# Altium footprint library cool_library.PcbLib: 1182 footprints (part 16 of 75)
Each footprint in its own frame and in the unit in brackets; x right, y up, seen from the top. Pads: shape width x height; smd on the part's side, far side on the other; paste and mask are expansions set on the pad; w line width, h text height; cw(c..) or ccw(c..) is an arc to the next point about the centre after c.
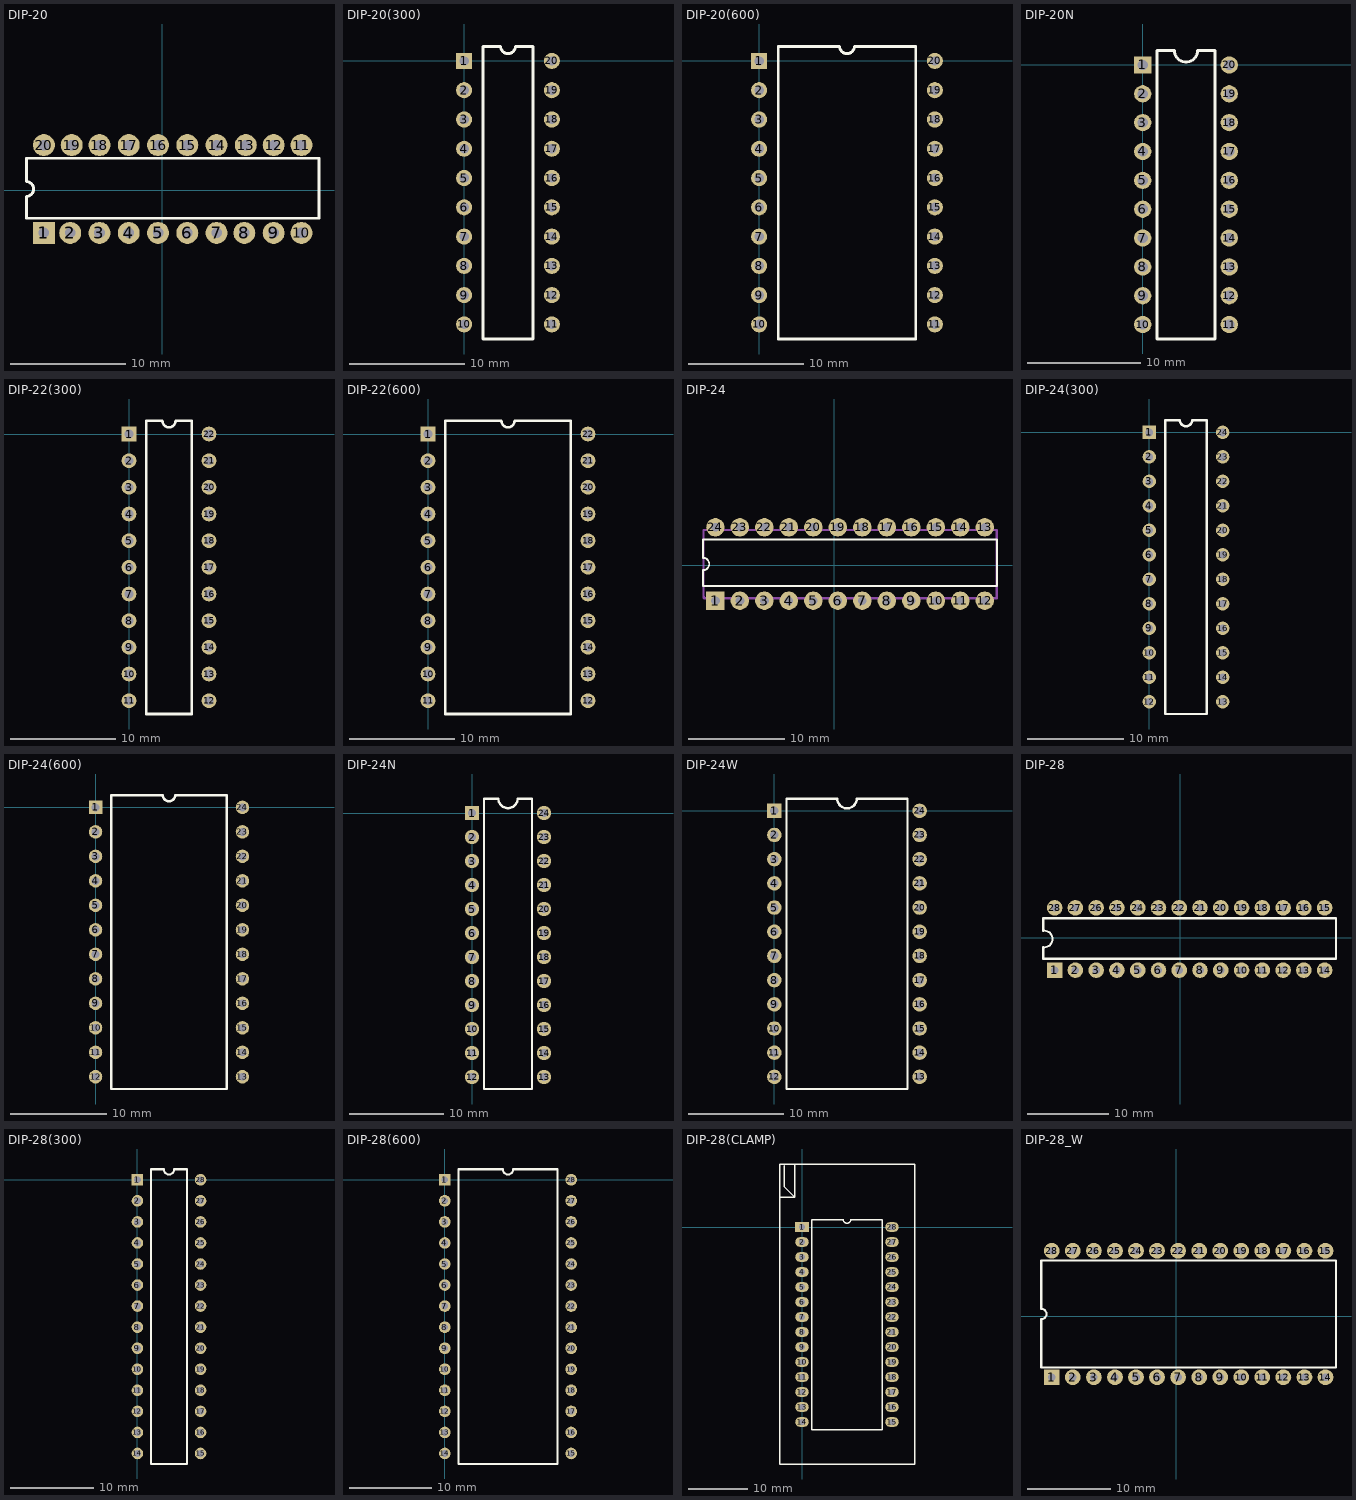
[diagram p15: the footprints below, top view; thin cyan lines are the x and y axes]

## DIP-20 [mil]
pads (20):
  rect 75x75 hole 36: 1(-405,-145)
  round 75 hole 36: 2(-315,-145) 3(-215,-145) 4(-115,-145) 5(-15,-145) 6(85,-145) 7(185,-145) 8(280,-145) 9(380,-145) 10(475,-145) 11(475,155) 12(380,155) 13(285,155) 14(185,155) 15(85,155) 16(-15,155) 17(-115,155) 18(-215,155) 19(-310,155) 20(-405,155)
Top Overlay:
  lines w10: -465,-95 -465,-20 ccw(c-465,5) -465,30 -465,110 535,110 535,-95 -465,-95
3D body: height 177.17, standoff -137.8, extent -468.93,-147.76 538.94,157.77

## DIP-20(300) [mil]
pads (20):
  rect 55x55 hole 32: 1(0,0)
  round 55 hole 32: 2(0,-100) 3(0,-200) 4(0,-300) 5(0,-400) 6(0,-500) 7(0,-600) 8(0,-700) 9(0,-800) 10(0,-900) 11(300,-900) 12(300,-800) 13(300,-700) 14(300,-600) 15(300,-500) 16(300,-400) 17(300,-300) 18(300,-200) 19(300,-100) 20(300,0)
Top Overlay:
  lines w10: 65,-950 65,50 125,50 ccw(c150,50) 175,50 235,50 235,-950 65,-950

## DIP-20(600) [mil]
pads (20):
  rect 55x55 hole 32: 1(0,0)
  round 55 hole 32: 2(0,-100) 3(0,-200) 4(0,-300) 5(0,-400) 6(0,-500) 7(0,-600) 8(0,-700) 9(0,-800) 10(0,-900) 11(600,-900) 12(600,-800) 13(600,-700) 14(600,-600) 15(600,-500) 16(600,-400) 17(600,-300) 18(600,-200) 19(600,-100) 20(600,0)
Top Overlay:
  lines w10: 65,-950 65,50 275,50 ccw(c300,50) 325,50 535,50 535,-950 65,-950

## DIP-20N [mil]
pads (20):
  rect 60x60 hole 35: 1(0,0)
  round 60 hole 35: 2(0,-100) 3(0,-200) 4(0,-300) 5(0,-400) 6(0,-500) 7(0,-600) 8(0,-700) 9(0,-800) 10(0,-900) 11(300,-900) 12(300,-800) 13(300,-700) 14(300,-600) 15(300,-500) 16(300,-400) 17(300,-300) 18(300,-200) 19(300,-100) 20(300,0)
Top Overlay:
  lines w10: 50,-950 250,-950 250,50 190,50 cw(c150,50) 110,50 50,50 50,-950

## DIP-22(300) [mil]
pads (22):
  rect 55x55 hole 32: 1(0,0)
  round 55 hole 32: 2(0,-100) 3(0,-200) 4(0,-300) 5(0,-400) 6(0,-500) 7(0,-600) 8(0,-700) 9(0,-800) 10(0,-900) 11(0,-1000) 12(300,-1000) 13(300,-900) 14(300,-800) 15(300,-700) 16(300,-600) 17(300,-500) 18(300,-400) 19(300,-300) 20(300,-200) 21(300,-100) 22(300,0)
Top Overlay:
  lines w10: 65,-1050 65,50 125,50 ccw(c150,50) 175,50 235,50 235,-1050 65,-1050

## DIP-22(600) [mil]
pads (22):
  rect 55x55 hole 32: 1(0,0)
  round 55 hole 32: 2(0,-100) 3(0,-200) 4(0,-300) 5(0,-400) 6(0,-500) 7(0,-600) 8(0,-700) 9(0,-800) 10(0,-900) 11(0,-1000) 12(600,-1000) 13(600,-900) 14(600,-800) 15(600,-700) 16(600,-600) 17(600,-500) 18(600,-400) 19(600,-300) 20(600,-200) 21(600,-100) 22(600,0)
Top Overlay:
  lines w10: 65,-1050 65,50 275,50 ccw(c300,50) 325,50 535,50 535,-1050 65,-1050

## DIP-24 [mil]
pads (24):
  rect 75x75 hole 36: 1(-485,-145)
  round 75 hole 36: 2(-385,-145) 3(-285,-145) 4(-185,-145) 5(-85,-145) 6(15,-145) 7(115,-145) 8(215,-145) 9(315,-145) 10(415,-145) 11(515,-145) 12(615,-145) 13(615,155) 14(515,155) 15(415,155) 16(315,155) 17(215,155) 18(115,155) 19(15,155) 20(-85,155) 21(-185,155) 22(-285,155) 23(-385,155) 24(-485,155)
Top Overlay:
  lines w7.87: -535,-85 -535,-20 ccw(c-535,5) -535,30 -535,105 665,105 665,-85 -535,-85
Mechanical 13:
  lines w10: -533.43,-126.16 ccw(c-519.98,-126.16) -529.49,-135.67 663.43,-135.67 663.43,143.86 -533.43,143.86 -533.43,29.68 -533.43,-126.16
3D body: height 179.92, standoff -150, extent -567.48,-148.93 697.48,158.94

## DIP-24(300) [mil]
pads (24):
  rect 55x55 hole 32: 1(0,0)
  round 55 hole 32: 2(0,-100) 3(0,-200) 4(0,-300) 5(0,-400) 6(0,-500) 7(0,-600) 8(0,-700) 9(0,-800) 10(0,-900) 11(0,-1000) 12(0,-1100) 13(300,-1100) 14(300,-1000) 15(300,-900) 16(300,-800) 17(300,-700) 18(300,-600) 19(300,-500) 20(300,-400) 21(300,-300) 22(300,-200) 23(300,-100) 24(300,0)
Top Overlay:
  lines w10: 65,-1150 65,50 125,50 ccw(c150,50) 175,50 235,50 235,-1150 65,-1150

## DIP-24(600) [mil]
pads (24):
  rect 55x55 hole 32: 1(0,0)
  round 55 hole 32: 2(0,-100) 3(0,-200) 4(0,-300) 5(0,-400) 6(0,-500) 7(0,-600) 8(0,-700) 9(0,-800) 10(0,-900) 11(0,-1000) 12(0,-1100) 13(600,-1100) 14(600,-1000) 15(600,-900) 16(600,-800) 17(600,-700) 18(600,-600) 19(600,-500) 20(600,-400) 21(600,-300) 22(600,-200) 23(600,-100) 24(600,0)
Top Overlay:
  lines w10: 65,-1150 65,50 275,50 ccw(c300,50) 325,50 535,50 535,-1150 65,-1150

## DIP-24N [mil]
pads (24):
  rect 60x60 hole 35: 1(0,0)
  round 60 hole 35: 2(0,-100) 3(0,-200) 4(0,-300) 5(0,-400) 6(0,-500) 7(0,-600) 8(0,-700) 9(0,-800) 10(0,-900) 11(0,-1000) 12(0,-1100) 13(300,-1100) 14(300,-1000) 15(300,-900) 16(300,-800) 17(300,-700) 18(300,-600) 19(300,-500) 20(300,-400) 21(300,-300) 22(300,-200) 23(300,-100) 24(300,0)
Top Overlay:
  lines w10: 50,-1150 50,60 110,60 ccw(c150,60) 190,60 250,60 250,-1150 50,-1150

## DIP-24W [mil]
pads (24):
  rect 60x60 hole 35: 1(0,0)
  round 60 hole 35: 2(0,-100) 3(0,-200) 4(0,-300) 5(0,-400) 6(0,-500) 7(0,-600) 8(0,-700) 9(0,-800) 10(0,-900) 11(0,-1000) 12(0,-1100) 13(600,-1100) 14(600,-1000) 15(600,-900) 16(600,-800) 17(600,-700) 18(600,-600) 19(600,-500) 20(600,-400) 21(600,-300) 22(600,-200) 23(600,-100) 24(600,0)
Top Overlay:
  lines w10: 50,-1150 550,-1150 550,50 340,50 cw(c300,50) 260,50 50,50 50,-1150

## DIP-28 [mil]
pads (28):
  rect 75x75 hole 36: 1(-605,-155)
  round 75 hole 36: 2(-505,-155) 3(-405,-155) 4(-305,-155) 5(-205,-155) 6(-105,-155) 7(-5,-155) 8(95,-155) 9(195,-155) 10(295,-155) 11(395,-155) 12(495,-155) 13(595,-155) 14(695,-155) 15(695,145) 16(595,145) 17(495,145) 18(395,145) 19(295,145) 20(195,145) 21(95,145) 22(-5,145) 23(-105,145) 24(-205,145) 25(-305,145) 26(-405,145) 27(-505,145) 28(-605,145)
Top Overlay:
  lines w10: -660,34.73 -660,95 750,95 750,-100 -659.96,-100 -659.96,-44.69 ccw(c-655,-5) -659.96,34.69
3D body: height 179.92, standoff -150, extent -644.96,-158.94 734.96,148.93

## DIP-28(300) [mil]
pads (28):
  rect 55x55 hole 32: 1(0,0)
  round 55 hole 32: 2(0,-100) 3(0,-200) 4(0,-300) 5(0,-400) 6(0,-500) 7(0,-600) 8(0,-700) 9(0,-800) 10(0,-900) 11(0,-1000) 12(0,-1100) 13(0,-1200) 14(0,-1300) 15(300,-1300) 16(300,-1200) 17(300,-1100) 18(300,-1000) 19(300,-900) 20(300,-800) 21(300,-700) 22(300,-600) 23(300,-500) 24(300,-400) 25(300,-300) 26(300,-200) 27(300,-100) 28(300,0)
Top Overlay:
  lines w10: 65,-1350 65,50 125,50 ccw(c150,50) 175,50 235,50 235,-1350 65,-1350

## DIP-28(600) [mil]
pads (28):
  rect 55x55 hole 32: 1(0,0)
  round 55 hole 32: 2(0,-100) 3(0,-200) 4(0,-300) 5(0,-400) 6(0,-500) 7(0,-600) 8(0,-700) 9(0,-800) 10(0,-900) 11(0,-1000) 12(0,-1100) 13(0,-1200) 14(0,-1300) 15(600,-1300) 16(600,-1200) 17(600,-1100) 18(600,-1000) 19(600,-900) 20(600,-800) 21(600,-700) 22(600,-600) 23(600,-500) 24(600,-400) 25(600,-300) 26(600,-200) 27(600,-100) 28(600,0)
Top Overlay:
  lines w10: 65,-1350 65,50 275,50 ccw(c300,50) 325,50 535,50 535,-1350 65,-1350

## DIP-28(CLAMP) [mil]
pads (28):
  rect 90x65 hole 40: 1(0,0)
  oval 90x65 hole 40: 2(0,-100) 3(0,-200) 4(0,-300) 5(0,-400) 6(0,-500) 7(0,-600) 8(0,-700) 9(0,-800) 10(0,-900) 11(0,-1000) 12(0,-1100) 13(0,-1200) 14(0,-1300) 15(600,-1300) 16(600,-1200) 17(600,-1100) 18(600,-1000) 19(600,-900) 20(600,-800) 21(600,-700) 22(600,-600) 23(600,-500) 24(600,-400) 25(600,-300) 26(600,-200) 27(600,-100) 28(600,0)
Top Overlay:
  lines w10: -150,200 -50,200 ; -120,410 -120,270 -50,200 ; -50,420 -50,200 ; -150,-1580 -150,420 750,420 750,-1580 -150,-1580 ; 65,-1350 535,-1350 535,50 325,50 cw(c300,50) 275,50 65,50 65,-1350

## DIP-28_W [mil]
pads (28):
  rect 75x75 hole 36: 1(-590,-290)
  round 75 hole 36: 2(-490,-290) 3(-390,-290) 4(-290,-290) 5(-190,-290) 6(-90,-290) 7(10,-290) 8(110,-290) 9(210,-290) 10(310,-290) 11(410,-290) 12(510,-290) 13(610,-290) 14(710,-290) 15(710,310) 16(610,310) 17(510,310) 18(410,310) 19(310,310) 20(210,310) 21(110,310) 22(10,310) 23(-90,310) 24(-190,310) 25(-290,310) 26(-390,310) 27(-490,310) 28(-590,310)
Top Overlay:
  lines w10: -640,-245 760,-245 760,265 -640,265 -640,35 cw(c-640,10) -640,-15 -640,-245
3D body: height 200.39, standoff -150, extent -675.04,-293.93 795.04,313.94